# Altium footprint library 14-Inductors.PcbLib: 164 footprints (part 5 of 11)
Each footprint in its own frame and in the unit in brackets; x right, y up, seen from the top. Pads: shape width x height; smd on the part's side, far side on the other; paste and mask are expansions set on the pad; w line width, h text height; cw(c..) or ccw(c..) is an arc to the next point about the centre after c.
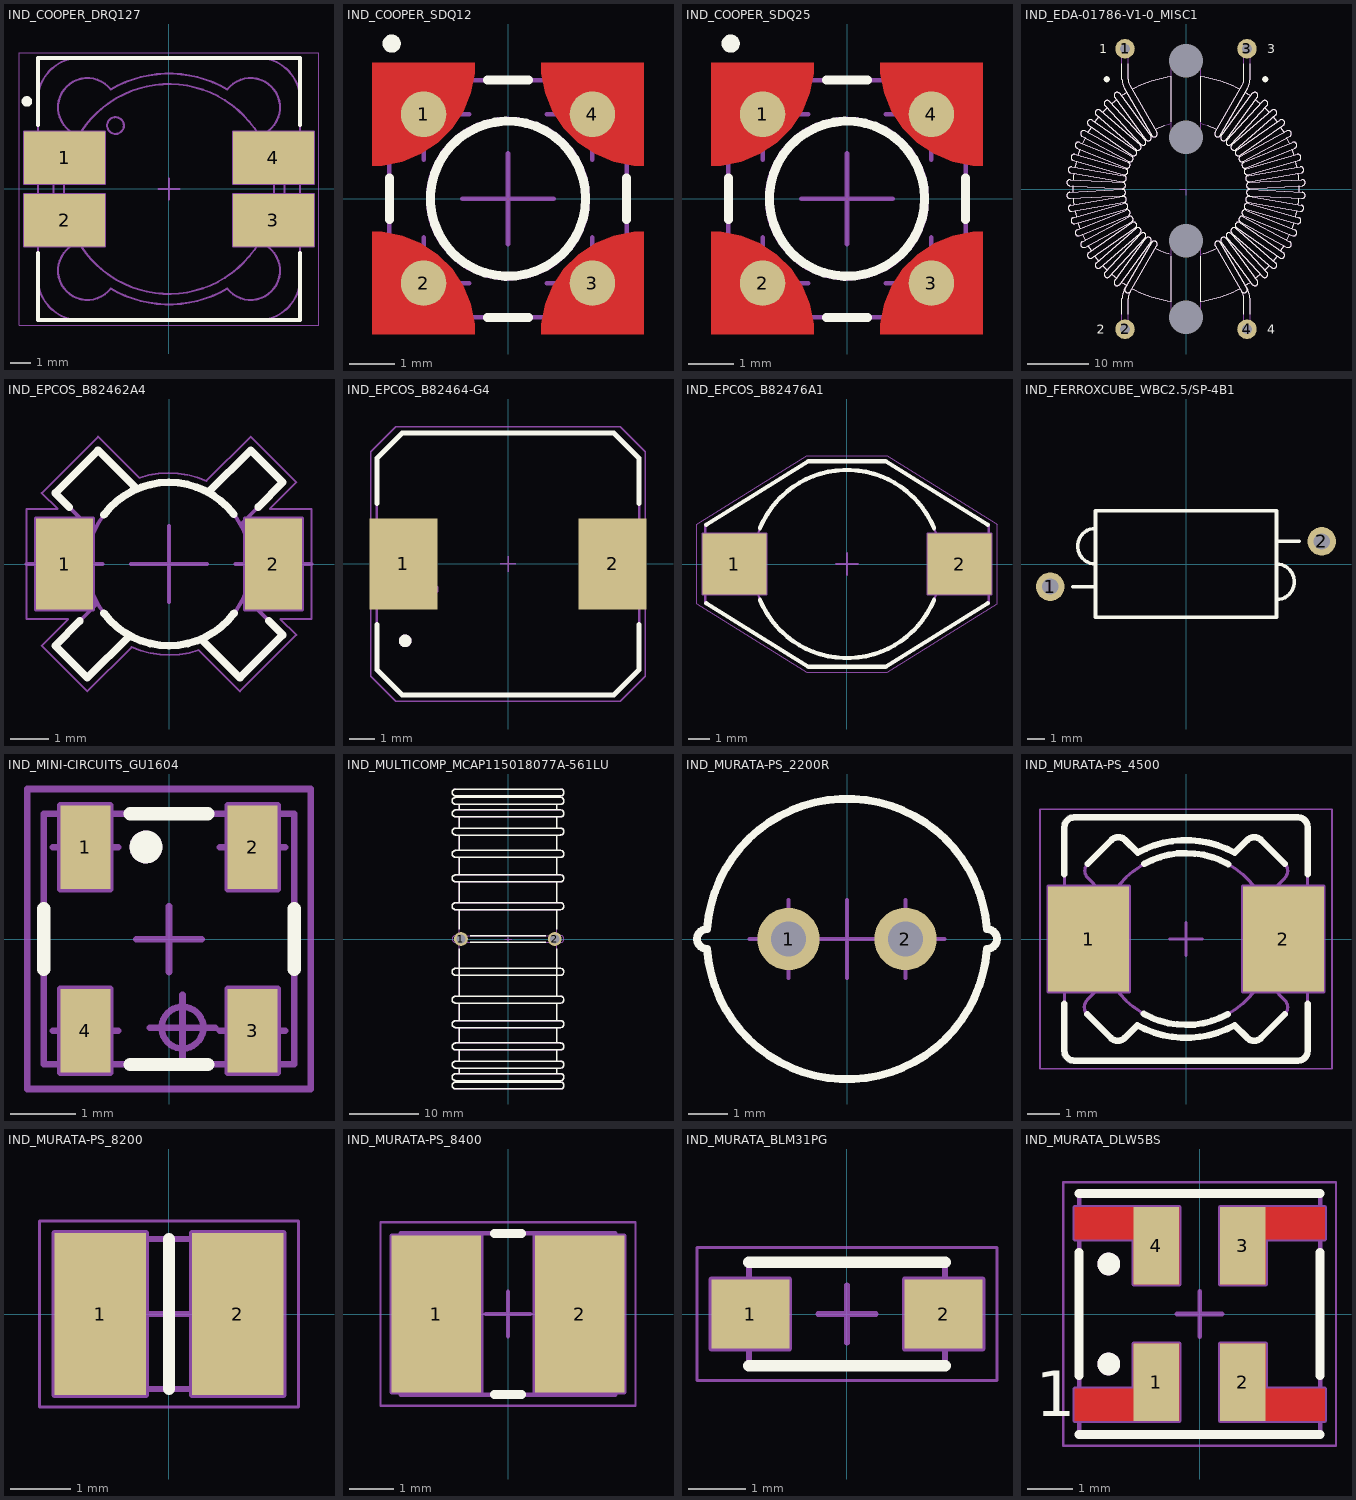
[diagram p4: the footprints below, top view; thin cyan lines are the x and y axes]

## IND_COOPER_DRQ127 [mm] "Dual Winding Shielded Inductor/Transformer DRQ Serie"
height 8
pads (4):
  rect 3.85x2.5 smd: 1(-4.975,1.5) 2(-4.975,-1.5) 3(4.975,-1.5) 4(4.975,1.5)
Top Overlay:
  circle w0.25: c-6.775,4.175 r0.125
  lines w0.2: -6.25,-3.05 -6.25,-6.25 6.25,-6.25 6.25,-3.05 ; -6.25,3.05 -6.25,6.25 6.25,6.25 6.25,3.05
Mechanical 8:
  lines w0.1: -5.475,-1.5 -4.975,-1.5 ; -5.475,1.5 -4.975,1.5 ; -4.975,-2 -4.975,-1.5 ; -4.975,-1 -4.975,-1.5 ; -4.975,1 -4.975,1.5 ; -4.975,2 -4.975,1.5 ; -4.475,-1.5 -4.975,-1.5 ; -4.475,1.5 -4.975,1.5 ; -0.5,0 0,0 ; 0,-0.5 0,0 ; 0,0.5 0,0 ; 0.5,0 0,0 ; 4.475,1.5 4.975,1.5 ; 4.975,1 4.975,1.5 ; 4.975,2 4.975,1.5 ; 5.475,1.5 4.975,1.5 ; -6.9,-2.75 -3.05,-2.75 -3.05,-0.25 -6.9,-0.25 -6.9,-2.75 ; -6.9,0.25 -3.05,0.25 -3.05,2.75 -6.9,2.75 -6.9,0.25 ; 3.05,-2.75 6.9,-2.75 6.9,-0.25 3.05,-0.25 3.05,-2.75 ; 3.05,0.25 6.9,0.25 6.9,2.75 3.05,2.75 3.05,0.25
Mechanical 14:
  circle w0.1: c0,0 r5
  circle w0.1: c-2.55,3.025 r0.4
  lines w0.1: -4.25,6.25 ccw(c-4.25,4.25) -6.25,4.25 -6.25,-4.25 ccw(c-4.25,-4.25) -4.25,-6.25 4.25,-6.25 ccw(c4.25,-4.25) 6.25,-4.25 6.25,4.25 ccw(c4.25,4.25) 4.25,6.25 ; -4.25,6.25 4.25,6.25 ; -4.25,6.25 4.25,6.25 ; -4.745,-2.781 ccw(c-3.889,-3.889) -2.781,-4.745 ccw(c0,0) 2.781,-4.745 ccw(c3.889,-3.889) 4.745,-2.781 ccw(c0,0) 4.745,2.781 ccw(c3.889,3.889) 2.781,4.745 ccw(c0,0) -2.781,4.745 ccw(c-3.889,3.889) -4.745,2.781 ccw(c0,0) -4.745,-2.781
Mechanical 15:
  lines w0.05: -7.15,-6.5 7.15,-6.5 7.15,6.5 -7.15,6.5 -7.15,-6.5
3D body "IND_COOPER_DRQ127.stp": height 8, standoff 0, extent -6.25,-6.25 6.25,6.25

## IND_COOPER_SDQ12 [mm] "Low-Profile Dual Winding Shielded Inductor/Transformer SDQ Serie"
height 1.2
pads (4):
  round 1 smd: 1(-1.85,1.85) 2(-1.85,-1.85) 3(1.85,-1.85) 4(1.85,1.85)
Top Layer:
  region: -2.975,-2.975 -0.725,-2.975 -0.725,-2.753 -0.811,-2.319 -0.981,-1.909 -1.227,-1.541 -1.541,-1.227 -1.909,-0.981 -2.319,-0.811 -2.753,-0.725 -2.975,-0.725
  region: 2.975,2.975 0.725,2.975 0.725,2.753 0.811,2.319 0.981,1.909 1.227,1.541 1.541,1.227 1.909,0.981 2.319,0.811 2.753,0.725 2.975,0.725
  region: 2.975,-2.975 2.975,-0.725 2.753,-0.725 2.319,-0.811 1.909,-0.981 1.541,-1.227 1.227,-1.541 0.981,-1.909 0.811,-2.319 0.725,-2.753 0.725,-2.975
  region: -2.975,2.975 -2.975,0.725 -2.753,0.725 -2.319,0.811 -1.909,0.981 -1.541,1.227 -1.227,1.541 -0.981,1.909 -0.811,2.319 -0.725,2.753 -0.725,2.975
Top Overlay:
  circle w0.2: c0,0 r1.7
  circle w0.2: c-2.55,3.4 r0.1
  lines w0.2: -2.6,-0.453 -2.6,0.453 ; -0.453,-2.6 0.453,-2.6 ; -0.453,2.6 0.453,2.6 ; 2.6,-0.453 2.6,0.453
Top Paste:
  region: -2.975,2.975 -2.975,0.725 -2.753,0.725 -2.319,0.811 -1.909,0.981 -1.541,1.227 -1.227,1.541 -0.981,1.909 -0.811,2.319 -0.725,2.753 -0.725,2.975
  region: 2.975,2.975 0.725,2.975 0.725,2.753 0.811,2.319 0.981,1.909 1.227,1.541 1.541,1.227 1.909,0.981 2.319,0.811 2.753,0.725 2.975,0.725
  region: -2.975,-2.975 -0.725,-2.975 -0.725,-2.753 -0.811,-2.319 -0.981,-1.909 -1.227,-1.541 -1.541,-1.227 -1.909,-0.981 -2.319,-0.811 -2.753,-0.725 -2.975,-0.725
  region: 2.975,-2.975 2.975,-0.725 2.753,-0.725 2.319,-0.811 1.909,-0.981 1.541,-1.227 1.227,-1.541 0.981,-1.909 0.811,-2.319 0.725,-2.753 0.725,-2.975
Top Solder:
  region: 0.627,-3.075 0.617,-2.831 0.697,-2.35 0.874,-1.895 1.141,-1.486 1.486,-1.141 1.895,-0.874 2.35,-0.697 2.831,-0.617 3.075,-0.627 3.075,-3.075
  region: 3.075,0.627 2.831,0.617 2.35,0.697 1.895,0.874 1.486,1.141 1.141,1.486 0.874,1.895 0.697,2.35 0.617,2.831 0.627,3.075 3.075,3.075
  region: -3.075,-0.627 -2.831,-0.617 -2.35,-0.697 -1.895,-0.874 -1.486,-1.141 -1.141,-1.486 -0.874,-1.895 -0.697,-2.35 -0.617,-2.831 -0.627,-3.075 -3.075,-3.075
  region: -0.627,3.075 -0.617,2.831 -0.697,2.35 -0.874,1.895 -1.141,1.486 -1.486,1.141 -1.895,0.874 -2.35,0.697 -2.831,0.617 -3.075,0.627 -3.075,3.075
Mechanical 8:
  lines w0.1: -2.85,-1.85 -1.85,-1.85 ; -2.85,1.85 -1.85,1.85 ; -1.85,-2.85 -1.85,-1.85 ; -1.85,-0.85 -1.85,-1.85 ; -1.85,0.85 -1.85,1.85 ; -1.85,2.85 -1.85,1.85 ; -1,0 0,0 ; -0.85,-1.85 -1.85,-1.85 ; -0.85,1.85 -1.85,1.85 ; 0,-1 0,0 ; 0,1 0,0 ; 0.85,-1.85 1.85,-1.85 ; 0.85,1.85 1.85,1.85 ; 1,0 0,0 ; 1.85,-2.85 1.85,-1.85 ; 1.85,-0.85 1.85,-1.85 ; 1.85,0.85 1.85,1.85 ; 1.85,2.85 1.85,1.85 ; 2.85,-1.85 1.85,-1.85 ; 2.85,1.85 1.85,1.85
Mechanical 14:
  circle w0.1: c0,0 r1.75
  circle w0.1: c-2.55,3.4 r0.1
  lines w0.1: -2.6,-2.6 -2.6,2.6 2.6,2.6 2.6,-2.6 -2.6,-2.6
3D body "IND_COOPER_SDQ12.stp": height 1.2, standoff 0, extent -2.6,-2.6 2.6,2.6

## IND_COOPER_SDQ25 [mm] "Low-Profile Dual Winding Shielded Inductor/Transformer SDQ Serie"
height 2.5
pads (4):
  round 1 smd: 1(-1.85,1.85) 2(-1.85,-1.85) 3(1.85,-1.85) 4(1.85,1.85)
Top Layer:
  region: -2.975,2.975 -2.975,0.725 -2.753,0.725 -2.319,0.811 -1.909,0.981 -1.541,1.227 -1.227,1.541 -0.981,1.909 -0.811,2.319 -0.725,2.753 -0.725,2.975
  region: 2.975,-2.975 2.975,-0.725 2.753,-0.725 2.319,-0.811 1.909,-0.981 1.541,-1.227 1.227,-1.541 0.981,-1.909 0.811,-2.319 0.725,-2.753 0.725,-2.975
  region: 2.975,2.975 0.725,2.975 0.725,2.753 0.811,2.319 0.981,1.909 1.227,1.541 1.541,1.227 1.909,0.981 2.319,0.811 2.753,0.725 2.975,0.725
  region: -2.975,-2.975 -0.725,-2.975 -0.725,-2.753 -0.811,-2.319 -0.981,-1.909 -1.227,-1.541 -1.541,-1.227 -1.909,-0.981 -2.319,-0.811 -2.753,-0.725 -2.975,-0.725
Top Overlay:
  circle w0.2: c-2.55,3.4 r0.1
  circle w0.2: c0,0 r1.7
  lines w0.2: -2.6,-0.453 -2.6,0.453 ; -0.453,-2.6 0.453,-2.6 ; -0.453,2.6 0.453,2.6 ; 2.6,-0.453 2.6,0.453
Top Paste:
  region: 2.975,-2.975 2.975,-0.725 2.753,-0.725 2.319,-0.811 1.909,-0.981 1.541,-1.227 1.227,-1.541 0.981,-1.909 0.811,-2.319 0.725,-2.753 0.725,-2.975
  region: -2.975,-2.975 -0.725,-2.975 -0.725,-2.753 -0.811,-2.319 -0.981,-1.909 -1.227,-1.541 -1.541,-1.227 -1.909,-0.981 -2.319,-0.811 -2.753,-0.725 -2.975,-0.725
  region: 2.975,2.975 0.725,2.975 0.725,2.753 0.811,2.319 0.981,1.909 1.227,1.541 1.541,1.227 1.909,0.981 2.319,0.811 2.753,0.725 2.975,0.725
  region: -2.975,2.975 -2.975,0.725 -2.753,0.725 -2.319,0.811 -1.909,0.981 -1.541,1.227 -1.227,1.541 -0.981,1.909 -0.811,2.319 -0.725,2.753 -0.725,2.975
Top Solder:
  region: -0.627,3.075 -0.617,2.831 -0.697,2.35 -0.874,1.895 -1.141,1.486 -1.486,1.141 -1.895,0.874 -2.35,0.697 -2.831,0.617 -3.075,0.627 -3.075,3.075
  region: -3.075,-0.627 -2.831,-0.617 -2.35,-0.697 -1.895,-0.874 -1.486,-1.141 -1.141,-1.486 -0.874,-1.895 -0.697,-2.35 -0.617,-2.831 -0.627,-3.075 -3.075,-3.075
  region: 3.075,0.627 2.831,0.617 2.35,0.697 1.895,0.874 1.486,1.141 1.141,1.486 0.874,1.895 0.697,2.35 0.617,2.831 0.627,3.075 3.075,3.075
  region: 0.627,-3.075 0.617,-2.831 0.697,-2.35 0.874,-1.895 1.141,-1.486 1.486,-1.141 1.895,-0.874 2.35,-0.697 2.831,-0.617 3.075,-0.627 3.075,-3.075
Mechanical 8:
  lines w0.1: -2.85,-1.85 -1.85,-1.85 ; -2.85,1.85 -1.85,1.85 ; -1.85,-2.85 -1.85,-1.85 ; -1.85,-0.85 -1.85,-1.85 ; -1.85,0.85 -1.85,1.85 ; -1.85,2.85 -1.85,1.85 ; -1,0 0,0 ; -0.85,-1.85 -1.85,-1.85 ; -0.85,1.85 -1.85,1.85 ; 0,-1 0,0 ; 0,1 0,0 ; 0.85,-1.85 1.85,-1.85 ; 0.85,1.85 1.85,1.85 ; 1,0 0,0 ; 1.85,-2.85 1.85,-1.85 ; 1.85,-0.85 1.85,-1.85 ; 1.85,0.85 1.85,1.85 ; 1.85,2.85 1.85,1.85 ; 2.85,-1.85 1.85,-1.85 ; 2.85,1.85 1.85,1.85
Mechanical 14:
  circle w0.1: c-2.55,3.4 r0.1
  circle w0.1: c0,0 r1.75
  lines w0.1: -2.6,-2.6 2.6,-2.6 2.6,2.6 -2.6,2.6 -2.6,-2.6
3D body "IND_COOPER_SDQ25.stp": height 2.5, standoff 0, extent -2.6,-2.6 2.6,2.6

## IND_EDA-01786-V1-0_MISC1 [mm] "see EDA-01786-V1-0_misc1"
height 33.8
pads (8):
  round 3.2 hole 1.6: 1(-10,23) 2(-10,-23) 3(10,23) 4(10,-23)
  round 1 hole 5.5 unplated mask+2.35: 5(0,-21) 5(0,-8.5) 5(0,8.5) 5(0,21)
Top Overlay:
  drawing of 226 lines, arcs and shapes, not listed
  text "4" at 13.286,-23.75 h1.5
  text "2" at -14.667,-23.75 h1.5
  text "3" at 13.333,22.25 h1.5
  text "1" at -14.238,22.25 h1.5
Mechanical 8:
  lines w0.1: -11,-23 -10,-23 -10,-24 ; -11,23 -10,23 -10,22 ; -1,-21 0,-21 0,-22 ; -1,-8.5 0,-8.5 0,-9.5 ; -1,0 0,0 0,-1 ; -1,8.5 0,8.5 0,7.5 ; -1,21 0,21 0,20 ; 9,-23 10,-23 10,-24 ; 9,23 10,23 10,22
Mechanical 14:
  drawing of 244 lines, arcs and shapes, not listed
3D body "IND_EDA-01786-V1-0_misc1.stp": height 33.8, standoff -7.2, extent -19.54,-23.5 19.54,23.5

## IND_EPCOS_B82462A4 [mm] "SMD Inductor  Body Width 6mm Body Lenght 6mm Height 3mm"
height 3
pads (2):
  rect 1.5x2.4 smd: 1(-2.75,0) 2(2.75,0)
Top Overlay:
  lines w0.2: -2.628,1.497 -3,1.869 -1.869,3 -0.845,1.977 ; -2.349,-1.501 -3,-2.151 -2.151,-3 -1.036,-1.884 ; -1.717,-1.294 ccw(c0,0) 1.717,-1.294 ; -1.717,1.294 cw(c0,0) 1.708,1.306 ; 0.845,-1.977 1.869,-3 3,-1.869 2.628,-1.497 ; 1.036,1.884 2.151,3 3,2.151 2.349,1.501
Mechanical 8:
  lines w0.1: -3.75,0 -2.75,0 ; -2.75,-1 -2.75,0 ; -2.75,1 -2.75,0 ; -1.75,0 -2.75,0 ; -1,0 0,0 ; 0,-1 0,0 ; 0,1 0,0 ; 1,0 0,0 ; 1.75,0 2.75,0 ; 2.75,-1 2.75,0 ; 2.75,1 2.75,0 ; 3.75,0 2.75,0 ; -3.5,-1.2 -2,-1.2 -2,1.2 -3.5,1.2 -3.5,-1.2 ; 2,-1.2 3.5,-1.2 3.5,1.2 2,1.2 2,-1.2
Mechanical 14:
  circle w0.1: c0,0 r2.15
  lines w0.1: -1.036,-1.884 -2.151,-3 -3,-2.151 -1.884,-1.036 -1.903,-1 -3,-1 -3,1 -2.131,1 -3,1.869 -1.869,3 -0.845,1.977 ; 0.845,-1.977 1.869,-3 3,-1.869 2.131,-1 3,-1 3,1 1.903,1 1.884,1.036 3,2.151 2.151,3 1.036,1.884
Mechanical 15:
  lines w0.05: -3.75,-1.45 -3.75,1.45 -2.935,1.45 -3.354,1.869 -1.869,3.354 -0.784,2.268 cw(c0,0) 0.986,2.188 2.151,3.354 3.354,2.151 2.652,1.45 3.75,1.45 3.75,-1.45 2.935,-1.45 3.354,-1.869 1.869,-3.354 0.784,-2.268 cw(c0,0) -0.986,-2.188 -2.151,-3.354 -3.354,-2.151 -2.652,-1.45 -3.75,-1.45
3D body "IND_EPCOS_B82462A4.stp": height 3, standoff 0, extent -3,-3 3,3

## IND_EPCOS_B82464-G4 [mm] "SMD Inductor  Body Width 10.4mm Body Lenght 10.4mm Height 4.8mm"
height 4.8
pads (2):
  rect 2.7x3.6 smd: 1(-4.15,0) 2(4.15,0)
Top Overlay:
  circle w0.25: c-4.075,-3.05 r0.125
  lines w0.2: -5.2,-2.4 -5.2,-4.2 -4.2,-5.2 4.2,-5.2 5.2,-4.2 5.2,-2.4 ; -5.2,2.4 -5.2,4.2 -4.2,5.2 4.2,5.2 5.2,4.2 5.2,2.4
Mechanical 14:
  circle w0.25: c-4.075,-3.05 r0.125
  circle w0.25: c-3,-1 r0.125
  lines w0.1: -5.2,-4.2 -4.2,-5.2 4.2,-5.2 5.2,-4.2 5.2,4.2 4.2,5.2 -4.2,5.2 -5.2,4.2 -5.2,-4.2
Mechanical 15:
  lines w0.05: -0.3,0 0.3,0 ; 0,-0.3 0,0.3 ; -5.45,-4.45 -4.45,-5.45 4.45,-5.45 5.45,-4.45 5.45,4.45 4.45,5.45 -4.45,5.45 -5.45,4.45 -5.45,-4.45
3D body "IND_EPCOS_B82464-G4.stp": height 4.9, standoff 0, extent -5.201,-5.201 5.199,5.199

## IND_EPCOS_B82476A1 [mm] "SMD Inductor  Body Width 9.4mm Body Lenght 12.95mm Height 5.08mm"
height 5.08
pads (2):
  rect 2.92x2.79 smd: 1(-5.145,0) 2(5.145,0)
Top Overlay:
  lines w0.2: -6.435,-1.795 -1.77,-4.7 1.77,-4.7 6.435,-1.795 ; -6.435,1.795 -1.77,4.7 1.77,4.7 6.435,1.795 ; -3.974,-1.642 ccw(c0,0) 3.974,-1.642 ; -3.974,1.642 cw(c0,0) 3.974,1.642
Mechanical 8:
  lines w0.1: -5.645,0 -5.145,0 ; -5.145,-0.5 -5.145,0 ; -5.145,0.5 -5.145,0 ; -4.645,0 -5.145,0 ; -0.5,0 0,0 ; 0,-0.5 0,0 ; 0,0.5 0,0 ; 0.5,0 0,0 ; 4.645,0 5.145,0 ; 5.145,-0.5 5.145,0 ; 5.145,0.5 5.145,0 ; 5.645,0 5.145,0 ; -6.605,-1.395 -3.685,-1.395 -3.685,1.395 -6.605,1.395 -6.605,-1.395 ; 3.685,-1.395 6.605,-1.395 6.605,1.395 3.685,1.395 3.685,-1.395
Mechanical 14:
  circle w0.1: c0,0 r4.3
  lines w0.1: -6.475,-1.27 -4.108,-1.27 ; -6.475,1.27 -4.108,1.27 ; 4.108,-1.27 6.475,-1.27 ; 4.108,1.27 6.475,1.27 ; -6.475,-1.77 -6.475,1.77 -1.77,4.7 1.77,4.7 6.475,1.77 6.475,-1.77 1.77,-4.7 -1.77,-4.7 -6.475,-1.77
Mechanical 15:
  lines w0.05: -6.855,-1.828 -6.855,1.828 -1.841,4.95 1.842,4.95 6.855,1.828 6.855,-1.828 1.842,-4.95 -1.841,-4.95 -6.855,-1.828
3D body "IND_EPCOS_B82476A1.stp": height 5.08, standoff 0, extent -6.475,-4.7 6.475,4.7

## IND_FERROXCUBE_WBC2.5/SP-4B1 [mm] "Wideband Choke, Axial, Pad spacing 15.24 mm - Body Lengh 10mm X Body Diameter 6mm"
height 6
pads (2):
  round 1.6 hole 0.9: 1(-7.62,-1.27) 2(7.62,1.27)
Top Overlay:
  lines w0.2: -6.35,-1.27 -5.08,-1.27 ; -5.08,0 cw(c-5.08,1) -5.08,2 ; 5.08,-2 ccw(c5.08,-1) 5.08,0 ; 5.08,1.27 6.35,1.27 ; -5.08,-3 5.08,-3 5.08,3 -5.08,3 -5.08,-3
Mechanical 14:
  lines w0.1: -6.35,-1.27 -5.08,-1.27 ; -5.08,0 cw(c-5.08,1) -5.08,2 ; 5.08,-2 ccw(c5.08,-1) 5.08,0 ; 5.08,1.27 6.35,1.27 ; -5.08,-3 5.08,-3 5.08,3 -5.08,3 -5.08,-3
3D body "IND_FERROXCUBE_WBC2.stp": height 6, standoff -3.6, extent -7.92,-2.947 7.92,3.053

## IND_MINI-CIRCUITS_GU1604 [mm] "MINI-CIRCUITS RF Choke, Case GU1041 - Body 3.81X3.81mm"
height 3.81
pads (4):
  rect 0.76x1.27 smd: 1(-1.27,1.394) 2(1.27,1.396) 3(1.27,-1.394) 4(-1.27,-1.396)
Top Overlay:
  circle w0.25: c-0.35,1.4 r0.125
  lines w0.2: -1.905,-0.459 -1.905,0.461 ; -0.59,-1.905 0.59,-1.905 ; -0.59,1.905 0.59,1.905 ; 1.905,-0.459 1.905,0.461
Mechanical 8:
  circle w0.1: c0.205,-1.347 r0.318
  lines w0.1: -1.77,-1.396 -1.27,-1.396 ; -1.77,1.394 -1.27,1.394 ; -1.27,-1.896 -1.27,-1.396 ; -1.27,-0.896 -1.27,-1.396 ; -1.27,0.894 -1.27,1.394 ; -1.27,1.894 -1.27,1.394 ; -0.77,-1.396 -1.27,-1.396 ; -0.77,1.394 -1.27,1.394 ; -0.295,-1.347 0.205,-1.347 ; 0.205,-1.847 0.205,-1.347 ; 0.205,-0.847 0.205,-1.347 ; 0.705,-1.347 0.205,-1.347 ; 0.77,-1.394 1.27,-1.394 ; 0.77,1.396 1.27,1.396 ; 1.27,-1.894 1.27,-1.394 ; 1.27,-0.894 1.27,-1.394 ; 1.27,0.896 1.27,1.396 ; 1.27,1.896 1.27,1.396 ; 1.77,-1.394 1.27,-1.394 ; 1.77,1.396 1.27,1.396 ; 0,0 -0.5,0 0,0 ; 0,0 0,-0.5 0,0 ; 0,0 0.5,0 0,0 ; 0,0 0,0.5 0,0 ; -1.65,-2.029 -0.89,-2.029 -0.89,-0.759 -1.65,-0.759 -1.65,-2.029 ; -1.65,0.761 -0.89,0.761 -0.89,2.031 -1.65,2.031 -1.65,0.761 ; 0.89,-2.029 1.65,-2.029 1.65,-0.759 0.89,-0.759 0.89,-2.029 ; 0.89,0.761 1.65,0.761 1.65,2.031 0.89,2.031 0.89,0.761
Mechanical 14:
  circle w0.1: c-0.35,1.4 r0.2
  lines w0.1: -1.905,-1.905 1.905,-1.905 1.905,1.905 -1.905,1.905 -1.905,-1.905
Mechanical 15:
  lines w0.1: -2.155,-2.279 2.155,-2.279 2.155,2.281 -2.155,2.281 -2.155,-2.279
3D body "IND_MINI-CIRCUITS_GU1604.stp": height 3.81, standoff 0, extent -1.905,-1.905 1.905,1.905

## IND_MULTICOMP_MCAP115018077A-561LU [mm] "Vertical Leaded Toroidal Inductor Lead Spacing 13.5mm D43mm x W16mm"
height 43
pads (2):
  round 2 hole 1.3: 1(-6.75,0) 2(6.7,0)
Top Overlay:
  lines w0.2: -7,-20.5 -7,-20.3 ; -7,-19.3 -7,-18.5 ; -7,-17.5 -7,-15.9 ; -7,-14.9 -7,-12.7 ; -7,-11.7 -7,-9.2 ; -7,-8.2 -7,-1.428 ; -7,1.428 -7,4.2 ; -7,5.2 -7,8.2 ; -7,9.2 -7,11.7 ; -7,12.7 -7,14.9 ; -7,15.9 -7,17.5 ; -7,18.5 -7,19.3 ; -7,20.3 -7,20.5 ; -5.389,-0.5 5.389,-0.5 ; -5.389,0.5 5.389,0.5 ; 7,-20.5 7,-20.3 ; 7,-19.3 7,-18.5 ; 7,-17.5 7,-15.9 ; 7,-14.9 7,-12.7 ; 7,-11.7 7,-9.2 ; 7,-8.2 7,-1.428 ; 7,1.428 7,4.2 ; 7,5.2 7,8.2 ; 7,9.2 7,11.7 ; 7,12.7 7,14.9 ; 7,15.9 7,17.5 ; 7,18.5 7,19.3 ; 7,20.3 7,20.5 ; -7.504,-21.5 cw(c-7.504,-21) -7.504,-20.5 7.5,-20.5 cw(c7.5,-21) 7.5,-21.5 -7.504,-21.5 ; -7.504,-20.3 cw(c-7.504,-19.8) -7.504,-19.3 7.5,-19.3 cw(c7.5,-19.8) 7.5,-20.3 -7.504,-20.3 ; -7.504,-18.5 cw(c-7.504,-18) -7.504,-17.5 7.5,-17.5 cw(c7.5,-18) 7.5,-18.5 -7.504,-18.5 ; -7.504,-15.9 cw(c-7.504,-15.4) -7.504,-14.9 7.5,-14.9 cw(c7.5,-15.4) 7.5,-15.9 -7.504,-15.9 ; -7.504,-12.7 cw(c-7.504,-12.2) -7.504,-11.7 7.5,-11.7 cw(c7.5,-12.2) 7.5,-12.7 -7.504,-12.7 ; -7.504,-9.2 cw(c-7.504,-8.7) -7.504,-8.2 7.5,-8.2 cw(c7.5,-8.7) 7.5,-9.2 -7.504,-9.2 ; -7.504,-5.2 cw(c-7.504,-4.7) -7.504,-4.2 7.5,-4.2 cw(c7.5,-4.7) 7.5,-5.2 -7.504,-5.2 ; -7.504,4.2 cw(c-7.504,4.7) -7.504,5.2 7.5,5.2 cw(c7.5,4.7) 7.5,4.2 -7.504,4.2 ; -7.504,8.2 cw(c-7.504,8.7) -7.504,9.2 7.5,9.2 cw(c7.5,8.7) 7.5,8.2 -7.504,8.2 ; -7.504,11.7 cw(c-7.504,12.2) -7.504,12.7 7.5,12.7 cw(c7.5,12.2) 7.5,11.7 -7.504,11.7 ; -7.504,14.9 cw(c-7.504,15.4) -7.504,15.9 7.5,15.9 cw(c7.5,15.4) 7.5,14.9 -7.504,14.9 ; -7.504,17.5 cw(c-7.504,18) -7.504,18.5 7.5,18.5 cw(c7.5,18) 7.5,17.5 -7.504,17.5 ; -7.504,19.3 cw(c-7.504,19.8) -7.504,20.3 7.5,20.3 cw(c7.5,19.8) 7.5,19.3 -7.504,19.3 ; -7.504,20.5 cw(c-7.504,21) -7.504,21.5 7.5,21.5 cw(c7.5,21) 7.5,20.5 -7.504,20.5
Mechanical 8:
  lines w0.1: -7.25,0 -6.75,0 ; -6.75,-0.5 -6.75,0 ; -6.75,0.5 -6.75,0 ; -6.25,0 -6.75,0 ; -0.5,0 0,0 ; 0,-0.5 0,0 ; 0,0.5 0,0 ; 0.5,0 0,0 ; 6.25,0 6.75,0 ; 6.75,-0.5 6.75,0 ; 6.75,0.5 6.75,0 ; 7.25,0 6.75,0
Mechanical 14:
  lines w0.1: -7,-20.5 -7,-20.3 ; -7,-19.3 -7,-18.5 ; -7,-17.5 -7,-15.9 ; -7,-14.9 -7,-12.7 ; -7,-11.7 -7,-9.2 ; -7,-8.2 -7,-0.5 ; -7,0.5 -7,4.2 ; -7,5.2 -7,8.2 ; -7,9.2 -7,11.7 ; -7,12.7 -7,14.9 ; -7,15.9 -7,17.5 ; -7,18.5 -7,19.3 ; -7,20.3 -7,20.5 ; 7,-20.5 7,-20.3 ; 7,-19.3 7,-18.5 ; 7,-17.5 7,-15.9 ; 7,-14.9 7,-12.7 ; 7,-11.7 7,-9.2 ; 7,-8.2 7,-0.5 ; 7,0.5 7,4.2 ; 7,5.2 7,8.2 ; 7,9.2 7,11.7 ; 7,12.7 7,14.9 ; 7,15.9 7,17.5 ; 7,18.5 7,19.3 ; 7,20.3 7,20.5 ; -7.504,-21.5 cw(c-7.504,-21) -7.504,-20.5 7.5,-20.5 cw(c7.5,-21) 7.5,-21.5 -7.504,-21.5 ; -7.504,-20.3 cw(c-7.504,-19.8) -7.504,-19.3 7.5,-19.3 cw(c7.5,-19.8) 7.5,-20.3 -7.504,-20.3 ; -7.504,-18.5 cw(c-7.504,-18) -7.504,-17.5 7.5,-17.5 cw(c7.5,-18) 7.5,-18.5 -7.504,-18.5 ; -7.504,-15.9 cw(c-7.504,-15.4) -7.504,-14.9 7.5,-14.9 cw(c7.5,-15.4) 7.5,-15.9 -7.504,-15.9 ; -7.504,-12.7 cw(c-7.504,-12.2) -7.504,-11.7 7.5,-11.7 cw(c7.5,-12.2) 7.5,-12.7 -7.504,-12.7 ; -7.504,-9.2 cw(c-7.504,-8.7) -7.504,-8.2 7.5,-8.2 cw(c7.5,-8.7) 7.5,-9.2 -7.504,-9.2 ; -7.504,-5.2 cw(c-7.504,-4.7) -7.504,-4.2 7.5,-4.2 cw(c7.5,-4.7) 7.5,-5.2 -7.504,-5.2 ; -7.504,-0.5 cw(c-7.504,0) -7.504,0.5 7.5,0.5 cw(c7.5,0) 7.5,-0.5 -7.504,-0.5 ; -7.504,4.2 cw(c-7.504,4.7) -7.504,5.2 7.5,5.2 cw(c7.5,4.7) 7.5,4.2 -7.504,4.2 ; -7.504,8.2 cw(c-7.504,8.7) -7.504,9.2 7.5,9.2 cw(c7.5,8.7) 7.5,8.2 -7.504,8.2 ; -7.504,11.7 cw(c-7.504,12.2) -7.504,12.7 7.5,12.7 cw(c7.5,12.2) 7.5,11.7 -7.504,11.7 ; -7.504,14.9 cw(c-7.504,15.4) -7.504,15.9 7.5,15.9 cw(c7.5,15.4) 7.5,14.9 -7.504,14.9 ; -7.504,17.5 cw(c-7.504,18) -7.504,18.5 7.5,18.5 cw(c7.5,18) 7.5,17.5 -7.504,17.5 ; -7.504,19.3 cw(c-7.504,19.8) -7.504,20.3 7.5,20.3 cw(c7.5,19.8) 7.5,19.3 -7.504,19.3 ; -7.504,20.5 cw(c-7.504,21) -7.504,21.5 7.5,21.5 cw(c7.5,21) 7.5,20.5 -7.504,20.5
3D body "IND_MULTICOMP_MCAP115018077A-561LU.stp": height 43, standoff -3.8, extent -8,-21.5 8,21.5

## IND_MURATA-PS_2200R [mm] "Radial Leaded Wire Wound Inductor D=7.7mm"
height 10.5
pads (2):
  round 1.6 hole 0.9: 1(-1.5,0) 2(1.5,0)
Top Overlay:
  lines w0.2: -3.591,-0.25 ccw(c0,0) 3.591,-0.25 ccw(c3.6,0) 3.591,0.25 ccw(c0,0) -3.591,0.25 ccw(c-3.6,0) -3.591,-0.25
Mechanical 8:
  lines w0.1: -2.5,0 -1.5,0 ; -1.5,-1 -1.5,0 ; -1.5,1 -1.5,0 ; -1,0 0,0 ; -0.5,0 -1.5,0 ; 0,-1 0,0 ; 0,1 0,0 ; 0.5,0 1.5,0 ; 1,0 0,0 ; 1.5,-1 1.5,0 ; 1.5,1 1.5,0 ; 2.5,0 1.5,0
Mechanical 14:
  lines w0.1: -3.591,-0.25 cw(c-3.6,0) -3.591,0.25 cw(c0,0) 3.591,0.25 cw(c3.6,0) 3.591,-0.25 cw(c0,0) -3.591,-0.25
3D body "INDRD_MURATA-PS_2200R.stp": height 10.5, standoff -3.3, extent -3.85,-3.6 3.85,3.6

## IND_MURATA-PS_4500 [mm] "Shielded Surface Mount Power Inductors, 7.3mm L X 7.3mm W X 3.55mm H, MURATA 4500 Serie"
height 3.55
pads (2):
  rect 2.5x3.25 smd: 1(-3,0) 2(3,0)
Top Overlay:
  lines w0.2: -3.75,-2 -3.75,-3.45 ccw(c-3.45,-3.45) -3.45,-3.75 3.45,-3.75 ccw(c3.45,-3.45) 3.75,-3.45 3.75,-2 ; -3.75,2 -3.75,3.45 cw(c-3.45,3.45) -3.45,3.75 3.45,3.75 cw(c3.45,3.45) 3.75,3.45 3.75,2 ; -3.045,-2.323 -2.323,-3.045 ccw(c-2.103,-2.826) -1.883,-3.045 -1.496,-2.658 ccw(c0,0) 1.496,-2.658 1.879,-3.04 ccw(c2.104,-2.825) 2.323,-3.045 3.045,-2.323 ; -3.029,2.323 -2.307,3.045 cw(c-2.087,2.826) -1.863,3.041 -1.486,2.664 cw(c0,0) 1.496,2.658 1.883,3.045 cw(c2.103,2.826) 2.323,3.045 3.045,2.323 ; -1.3,-2.309 ccw(c0,0) 1.291,-2.314 ; -1.291,2.314 cw(c0,0) 1.3,2.309
Top Solder:
  region: 2.85,0.6 1.7,0.6 1.7,-0.6 2.85,-0.6
  rectangle: -2.85,-0.6 -1.7,0.6
Mechanical 8:
  lines w0.1: -3.5,0 -3,0 ; -3,-0.5 -3,0 ; -3,0.5 -3,0 ; -2.5,0 -3,0 ; -0.5,0 0,0 ; 0,-0.5 0,0 ; 0,0.5 0,0 ; 0.5,0 0,0 ; 2.5,0 3,0 ; 3,-0.5 3,0 ; 3,0.5 3,0 ; 3.5,0 3,0 ; -4.25,-1.625 -1.75,-1.625 -1.75,1.625 -4.25,1.625 -4.25,-1.625 ; 1.75,-1.625 1.75,1.625 4.25,1.625 4.25,-1.625 1.75,-1.625
Mechanical 14:
  circle w0.1: c0,0 r2.65
  lines w0.1: -1.5,3.75 1.5,3.75 ; -3.75,-3.45 ccw(c-3.45,-3.45) -3.45,-3.75 3.45,-3.75 ccw(c3.45,-3.45) 3.75,-3.45 3.75,3.45 ccw(c3.45,3.45) 3.45,3.75 -3.45,3.75 ccw(c-3.45,3.45) -3.75,3.45 -3.75,-3.45 ; -3.045,-2.323 cw(c-2.825,-2.104) -3.04,-1.879 -2.658,-1.496 cw(c0,0) -2.652,1.506 -3.029,1.884 cw(c-2.809,2.103) -3.029,2.323 -2.307,3.045 cw(c-2.087,2.826) -1.863,3.041 -1.486,2.664 cw(c0,0) 1.496,2.658 1.883,3.045 cw(c2.103,2.826) 2.323,3.045 3.045,2.323 cw(c2.825,2.104) 3.04,1.879 2.658,1.496 cw(c0,0) 2.658,-1.496 3.045,-1.883 cw(c2.826,-2.103) 3.045,-2.323 2.323,-3.045 cw(c2.104,-2.825) 1.879,-3.04 1.496,-2.658 cw(c0,0) -1.496,-2.658 -1.883,-3.045 cw(c-2.103,-2.826) -2.323,-3.045 -3.045,-2.323
Mechanical 15:
  lines w0.05: -4.5,-4 4.5,-4 4.5,4 -4.5,4 -4.5,-4
3D body "IND_MURATA-PS_4500.stp": height 3.55, standoff 0, extent -3.75,-3.75 3.75,3.75

## IND_MURATA-PS_8200 [mm] "Miniature Surface Mount Power Inductors, 3.2mm L X 2.5mm W X 2.3mm H, MURATA 8200 Serie"
height 2.3
pads (2):
  rect 1.52x2.7 smd: 1(-1.145,0) 2(1.145,0)
Top Overlay:
  lines w0.2: 0,-1.25 0,1.25
Mechanical 8:
  lines w0.1: -1.645,0 -1.145,0 ; -1.145,-0.5 -1.145,0 ; -1.145,0.5 -1.145,0 ; -0.645,0 -1.145,0 ; -0.5,0 0,0 ; 0,-0.5 0,0 ; 0,0.5 0,0 ; 0.5,0 0,0 ; 0.645,0 1.145,0 ; 1.145,-0.5 1.145,0 ; 1.145,0.5 1.145,0 ; 1.645,0 1.145,0 ; -1.905,-1.35 -0.385,-1.35 -0.385,1.35 -1.905,1.35 -1.905,-1.35 ; 0.385,-1.35 1.905,-1.35 1.905,1.35 0.385,1.35 0.385,-1.35
Mechanical 14:
  lines w0.1: -1.193,-1.25 cw(c-1.193,-1.15) -1.293,-1.15 -1.293,1.15 cw(c-1.193,1.15) -1.193,1.25 ; 1.193,-1.25 ccw(c1.193,-1.15) 1.293,-1.15 1.293,1.15 ccw(c1.193,1.15) 1.193,1.25 ; -1.6,-1.25 1.6,-1.25 1.6,1.25 -1.6,1.25 -1.6,-1.25
Mechanical 15:
  lines w0.05: -2.155,-1.55 -2.155,1.55 2.155,1.55 2.155,-1.55 -2.155,-1.55
3D body "IND_MURATA-PS_8200.stp": height 2.3, standoff 0, extent -1.6,-1.25 1.6,1.25

## IND_MURATA-PS_8400 [mm] "Miniature Surface Mount Power Inductors, 4.5mm L X 3.3mm W X 2.9mm H, MURATA 8400 Serie"
height 2.9
pads (2):
  rect 2x3.5 smd: 1(-1.6,0) 2(1.6,0)
Top Overlay:
  lines w0.2: -0.3,-1.8 0.3,-1.8 ; -0.3,1.8 0.3,1.8
Mechanical 8:
  lines w0.1: -2.1,0 -1.6,0 ; -1.6,-0.5 -1.6,0 ; -1.6,0.5 -1.6,0 ; -1.1,0 -1.6,0 ; -0.5,0 0,0 ; 0,-0.5 0,0 ; 0,0.5 0,0 ; 0.5,0 0,0 ; 1.1,0 1.6,0 ; 1.6,-0.5 1.6,0 ; 1.6,0.5 1.6,0 ; 2.1,0 1.6,0 ; -2.6,-1.75 -0.6,-1.75 -0.6,1.75 -2.6,1.75 -2.6,-1.75 ; 0.6,-1.75 2.6,-1.75 2.6,1.75 0.6,1.75 0.6,-1.75
Mechanical 14:
  lines w0.1: -1.8,-1.8 -1.8,1.8 ; 1.8,-1.8 1.8,1.8 ; -2.4,-1.8 -2.4,1.8 2.4,1.8 2.4,-1.8 -2.4,-1.8
Mechanical 15:
  lines w0.05: -2.85,-2.05 2.85,-2.05 2.85,2.05 -2.85,2.05 -2.85,-2.05
3D body "IND_MURATA-PS_8400.stp": height 2.9, standoff 0, extent -2.4,-1.8 2.4,1.8

## IND_MURATA_BLM31PG [mm] "Chip Ferrite Bead, 3.20mm L X 1.60mm W, BLM31PG Series"
height 1.3
pads (2):
  rect 1.35x1.2 smd: 1(-1.675,0) 2(1.675,0)
Top Overlay:
  lines w0.2: -1.7,-0.9 1.7,-0.9 ; -1.7,0.9 1.7,0.9
Mechanical 8:
  lines w0.1: -2.175,0 -1.675,0 ; -1.675,-0.5 -1.675,0 ; -1.675,0.5 -1.675,0 ; -1.175,0 -1.675,0 ; -0.5,0 0,0 ; 0,-0.5 0,0 ; 0,0.5 0,0 ; 0.5,0 0,0 ; 1.175,0 1.675,0 ; 1.675,-0.5 1.675,0 ; 1.675,0.5 1.675,0 ; 2.175,0 1.675,0 ; -2.35,-0.6 -1,-0.6 -1,0.6 -2.35,0.6 -2.35,-0.6 ; 1,-0.6 2.35,-0.6 2.35,0.6 1,0.6 1,-0.6
Mechanical 14:
  lines w0.1: -1.7,-0.9 -1.7,0.9 1.7,0.9 1.7,-0.9 -1.7,-0.9
Mechanical 15:
  lines w0.05: -2.6,-1.15 -2.6,1.15 2.6,1.15 2.6,-1.15 -2.6,-1.15
3D body "IND_MURATA_BLM31PG.stp": height 1.3, standoff 0, extent -1.6,-0.8 1.6,0.8

## IND_MURATA_DLW5BS [mm] "Common Mode Choke Coil, DLW5BS Series - Body 5.0 x 5.0mm"
height 4.5
pads (4):
  rect 1x1.7 smd: 1(-0.95,-1.5) 2(0.95,-1.5) 3(0.95,1.5) 4(-0.95,1.5)
Top Layer:
  region: 0.45,0.65 0.45,2.35 2.75,2.35 2.75,1.65 1.45,1.65 1.45,0.65
  region: -0.45,-0.65 -0.45,-2.35 -2.75,-2.35 -2.75,-1.65 -1.45,-1.65 -1.45,-0.65
  region: 0.45,-0.65 0.45,-2.35 2.75,-2.35 2.75,-1.65 1.45,-1.65 1.45,-0.65
  region: -0.45,0.65 -0.45,2.35 -2.75,2.35 -2.75,1.65 -1.45,1.65 -1.45,0.65
Top Overlay:
  circle w0.25: c-2,-1.1 r0.125
  circle w0.25: c-2,1.1 r0.125
  lines w0.2: -2.65,-2.65 2.65,-2.65 ; -2.65,-1.35 -2.65,1.35 ; -2.65,2.65 2.65,2.65 ; 2.65,-1.35 2.65,1.35
  text "1" at -3.6,-2.25 h1
Mechanical 8:
  lines w0.1: -1.45,-1.5 -0.95,-1.5 ; -1.45,1.5 -0.95,1.5 ; -0.95,-2 -0.95,-1.5 ; -0.95,-1 -0.95,-1.5 ; -0.95,1 -0.95,1.5 ; -0.95,2 -0.95,1.5 ; -0.5,0 0,0 ; -0.45,-1.5 -0.95,-1.5 ; -0.45,1.5 -0.95,1.5 ; 0,-0.5 0,0 ; 0,0.5 0,0 ; 0.45,-1.5 0.95,-1.5 ; 0.45,1.5 0.95,1.5 ; 0.5,0 0,0 ; 0.95,-2 0.95,-1.5 ; 0.95,-1 0.95,-1.5 ; 0.95,1 0.95,1.5 ; 0.95,2 0.95,1.5 ; 1.45,-1.5 0.95,-1.5 ; 1.45,1.5 0.95,1.5 ; -2.75,-2.35 -2.75,-1.65 -1.45,-1.65 -1.45,-0.65 -0.45,-0.65 -0.45,-2.35 -2.75,-2.35 ; -2.75,1.65 -2.75,2.35 -0.45,2.35 -0.45,0.65 -1.45,0.65 -1.45,1.65 -2.75,1.65 ; 0.45,-2.35 2.75,-2.35 2.75,-1.65 1.45,-1.65 1.45,-0.65 0.45,-0.65 0.45,-2.35 ; 0.45,0.65 0.45,2.35 2.75,2.35 2.75,1.65 1.45,1.65 1.45,0.65 0.45,0.65
Mechanical 14:
  circle w0.25: c-2,1.1 r0.125
  circle w0.25: c-2,-1.1 r0.125
  lines w0.1: -2.65,-2.65 -2.65,2.65 2.65,2.65 2.65,-2.65 -2.65,-2.65
Mechanical 15:
  lines w0.05: -3,-2.9 -3,2.9 3,2.9 3,-2.9 -3,-2.9
3D body "IND_MURATA_DLW5BS.stp": height 4.5, standoff 0, extent -2.65,-2.65 2.65,2.65